# Altium footprint library RF Module.PcbLib: 28 footprints (part 2 of 2)
Each footprint in its own frame and in the unit in brackets; x right, y up, seen from the top. Pads: shape width x height; smd on the part's side, far side on the other; paste and mask are expansions set on the pad; w line width, h text height; cw(c..) or ccw(c..) is an arc to the next point about the centre after c.
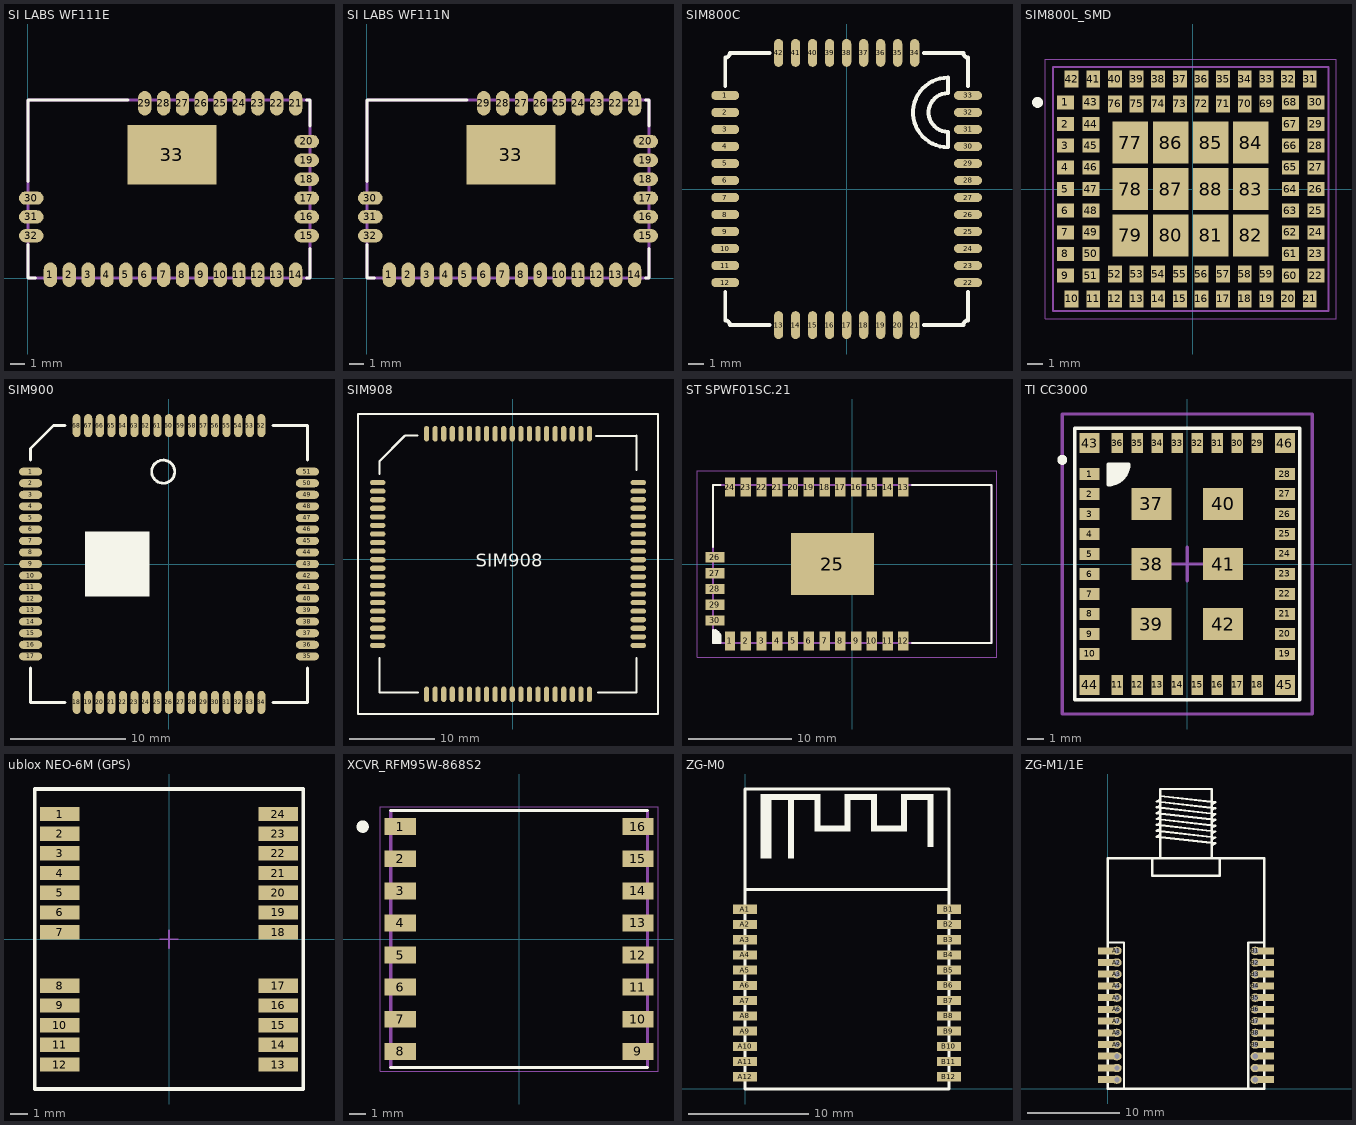
[diagram p1: the footprints below, top view; thin cyan lines are the x and y axes]

## SI LABS WF111E [mm]
height 2.1
pads (33):
  oval 0.9x1.65 smd: 1(1.515,0.225) 2(2.785,0.225) 3(4.055,0.225) 4(5.325,0.225) 5(6.595,0.225) 6(7.865,0.225) 7(9.135,0.225) 8(10.405,0.225) 9(11.675,0.225) 10(12.945,0.225) 11(14.215,0.225) 12(15.485,0.225) 13(16.755,0.225) 14(18.025,0.225) 21(18.025,11.775) 22(16.755,11.775) 23(15.485,11.775) 24(14.215,11.775) 25(12.945,11.775) 26(11.675,11.775) 27(10.405,11.775) 28(9.135,11.775) 29(7.865,11.775)
  oval 1.65x0.9 smd: 15(18.775,2.85) 16(18.775,4.12) 17(18.775,5.39) 18(18.775,6.66) 19(18.775,7.93) 20(18.775,9.2) 30(0.225,5.39) 31(0.225,4.12) 32(0.225,2.85)
  rect 6x4 smd: 33(9.7,8.3)
Top Overlay:
  lines w0.2: 0,2.25 0,0 0.5,0 ; 0,6.5 0,12 6.75,12 ; 18.75,0 19,0 19,2 ; 18.75,12 19,12 19,10.25
Mechanical 1:
  lines w0.2: 0,0 0,12 19,12 19,0 0,0
3D body "WF111E.STEP": height 2.2, standoff 0, extent 0,0 19,12

## SI LABS WF111N [mm]
height 2.1
pads (33):
  oval 0.9x1.65 smd: 1(1.515,0.225) 2(2.785,0.225) 3(4.055,0.225) 4(5.325,0.225) 5(6.595,0.225) 6(7.865,0.225) 7(9.135,0.225) 8(10.405,0.225) 9(11.675,0.225) 10(12.945,0.225) 11(14.215,0.225) 12(15.485,0.225) 13(16.755,0.225) 14(18.025,0.225) 21(18.025,11.775) 22(16.755,11.775) 23(15.485,11.775) 24(14.215,11.775) 25(12.945,11.775) 26(11.675,11.775) 27(10.405,11.775) 28(9.135,11.775) 29(7.865,11.775)
  oval 1.65x0.9 smd: 15(18.775,2.85) 16(18.775,4.12) 17(18.775,5.39) 18(18.775,6.66) 19(18.775,7.93) 20(18.775,9.2) 30(0.225,5.39) 31(0.225,4.12) 32(0.225,2.85)
  rect 6x4 smd: 33(9.7,8.3)
Top Overlay:
  lines w0.2: 0,2.25 0,0 0.5,0 ; 0,6.5 0,12 6.75,12 ; 18.75,0 19,0 19,2 ; 18.75,12 19,12 19,10.25
Mechanical 1:
  lines w0.2: 0,0 0,12 19,12 19,0 0,0
3D body "WF111N.STEP": height 2.1, standoff 0, extent 0,0 19,12

## SIM800C [mm]
pads (42):
  oval 1.8x0.6 smd: 1(-7.85,6.05) 2(-7.85,4.95) 3(-7.85,3.85) 4(-7.85,2.75) 5(-7.85,1.65) 6(-7.85,0.55) 7(-7.85,-0.55) 8(-7.85,-1.65) 9(-7.85,-2.75) 10(-7.85,-3.85) 11(-7.85,-4.95) 12(-7.85,-6.05) 22(7.85,-6.05) 23(7.85,-4.95) 24(7.85,-3.85) 25(7.85,-2.75) 26(7.85,-1.65) 27(7.85,-0.55) 28(7.85,0.55) 29(7.85,1.65) 30(7.85,2.75) 31(7.85,3.85) 32(7.85,4.95) 33(7.85,6.05)
  oval 0.6x1.8 smd: 13(-4.4,-8.8) 14(-3.3,-8.8) 15(-2.2,-8.8) 16(-1.1,-8.8) 17(0,-8.8) 18(1.1,-8.8) 19(2.2,-8.8) 20(3.3,-8.8) 21(4.4,-8.8) 34(4.4,8.8) 35(3.3,8.8) 36(2.2,8.8) 37(1.1,8.8) 38(0,8.8) 39(-1.1,8.8) 40(-2.2,8.8) 41(-3.3,8.8) 42(-4.4,8.8)
Top Overlay:
  lines w0.254: -7.85,-6.65 -7.85,-8.5 cw(c-7.85,-8.8) -7.55,-8.8 -5,-8.8 ; -7.85,6.65 -7.85,8.5 ccw(c-7.85,8.8) -7.55,8.8 -5,8.8 ; 5,-8.8 7.55,-8.8 cw(c7.85,-8.8) 7.85,-8.5 7.85,-6.65 ; 5,8.8 7.55,8.8 ccw(c7.85,8.8) 7.85,8.5 7.85,6.65 ; 6.55,2.7 cw(c6.55,4.95) 6.55,7.2 6.55,6.2 ccw(c6.55,4.95) 6.55,3.7 6.55,2.7
3D body "User Library-SIM800C-1.STEP": height 2.37, standoff 0.03, extent -7.85,-8.8 7.85,8.8

## SIM800L_SMD [mm]
pads (88):
  rect 1.1x0.9 smd: 1(-8.252,5.625) 2(-8.252,4.225) 3(-8.252,2.825) 4(-8.252,1.425) 5(-8.252,0.025) 6(-8.252,-1.375) 7(-8.252,-2.775) 8(-8.252,-4.175) 9(-8.252,-5.575) 22(7.948,-5.575) 23(7.948,-4.175) 24(7.948,-2.775) 25(7.948,-1.375) 26(7.948,0.025) 27(7.948,1.425) 28(7.948,2.825) 29(7.948,4.225) 30(7.948,5.625) 43(-6.602,5.625) 44(-6.602,4.225) 45(-6.602,2.825) 46(-6.602,1.425) 47(-6.602,0.025) 48(-6.602,-1.375) 49(-6.602,-2.775) 50(-6.602,-4.175) 51(-6.602,-5.575) 60(6.298,-5.575) 61(6.298,-4.175) 62(6.298,-2.775) 63(6.298,-1.375) 64(6.298,0.025) 65(6.298,1.425) 66(6.298,2.825) 67(6.298,4.225) 68(6.298,5.625)
  rect 0.9x1.1 smd: 10(-7.852,-7.075) 11(-6.452,-7.075) 12(-5.052,-7.075) 13(-3.652,-7.075) 14(-2.252,-7.075) 15(-0.852,-7.075) 16(0.548,-7.075) 17(1.948,-7.075) 18(3.348,-7.075) 19(4.748,-7.075) 20(6.148,-7.075) 21(7.548,-7.075) 31(7.548,7.125) 32(6.148,7.125) 33(4.748,7.125) 34(3.348,7.125) 35(1.948,7.125) 36(0.548,7.125) 37(-0.852,7.125) 38(-2.252,7.125) 39(-3.652,7.125) 40(-5.052,7.125) 41(-6.452,7.125) 42(-7.852,7.125) 52(-5.052,-5.475) 53(-3.652,-5.475) 54(-2.252,-5.475) 55(-0.852,-5.475) 56(0.548,-5.475) 57(1.948,-5.475) 58(3.348,-5.475) 59(4.748,-5.475) 69(4.748,5.525) 70(3.348,5.525) 71(1.948,5.525) 72(0.548,5.525) 73(-0.852,5.525) 74(-2.252,5.525) 75(-3.652,5.525) 76(-5.052,5.525)
  rect 2.3x2.7 smd: 77(-4.052,3.025) 78(-4.052,0.025) 79(-4.052,-2.975) 80(-1.452,-2.975) 81(1.148,-2.975) 82(3.748,-2.975) 83(3.748,0.025) 84(3.748,3.025) 85(1.148,3.025) 86(-1.452,3.025) 87(-1.452,0.025) 88(1.148,0.025)
Top Overlay:
  circle w0.5: c-10.052,5.625 r0.1
Mechanical 13:
  circle w0.2: c-10.052,5.625 r0.1
  lines w0.127: -9.052,-7.875 -9.052,7.925 8.748,7.925 8.748,-7.875 -9.052,-7.875
Mechanical 15:
  lines w0.05: -9.552,-8.375 9.248,-8.375 9.248,8.425 -9.552,8.425 -9.552,-8.375
3D body "step_temp.STEP": height 2.55, standoff 0, extent -9.052,-7.875 8.748,7.925

## SIM900 [mm]
height 10.95
pads (68):
  oval 2x0.7 smd: 1(-12,8) 2(-12,7) 3(-12,6) 4(-12,5) 5(-12,4) 6(-12,3) 7(-12,2) 8(-12,1) 9(-12,0) 10(-12,-1) 11(-12,-2) 12(-12,-3) 13(-12,-4) 14(-12,-5) 15(-12,-6) 16(-12,-7) 17(-12,-8) 35(12,-8) 36(12,-7) 37(12,-6) 38(12,-5) 39(12,-4) 40(12,-3) 41(12,-2) 42(12,-1) 43(12,0) 44(12,1) 45(12,2) 46(12,3) 47(12,4) 48(12,5) 49(12,6) 50(12,7) 51(12,8)
  oval 0.7x2 smd: 18(-8,-12) 19(-7,-12) 20(-6,-12) 21(-5,-12) 22(-4,-12) 23(-3,-12) 24(-2,-12) 25(-1,-12) 26(0,-12) 27(1,-12) 28(2,-12) 29(3,-12) 30(4,-12) 31(5,-12) 32(6,-12) 33(7,-12) 34(8,-12) 52(8,12) 53(7,12) 54(6,12) 55(5,12) 56(4,12) 57(3,12) 58(2,12) 59(1,12) 60(0,12) 61(-1,12) 62(-2,12) 63(-3,12) 64(-4,12) 65(-5,12) 66(-6,12) 67(-7,12) 68(-8,12)
Top Overlay:
  circle w0.254: c-0.5,8 r1
  rectangle: -7.3,-2.8 -1.7,2.8
  lines w0.254: -12,-9 -12,-12 -9,-12 ; -12,9 -12,10 -10,12 -9,12 ; 9,-12 12,-12 12,-9 ; 9,12 12,12 12,9
3D body "User Library-SIM900.STEP": height 3.02, standoff 0, extent -12,-12 12,12

## SIM908 [mm]
pads (80):
  oval 1.8x0.6 smd: 1(-15.731,8.952) 2(-15.731,7.952) 3(-15.731,6.952) 4(-15.731,5.952) 5(-15.731,4.952) 6(-15.731,3.952) 7(-15.731,2.952) 8(-15.731,1.952) 9(-15.731,0.952) 10(-15.731,-0.048) 11(-15.731,-1.048) 12(-15.731,-2.048) 13(-15.731,-3.048) 14(-15.731,-4.048) 15(-15.731,-5.048) 16(-15.731,-6.048) 17(-15.731,-7.048) 18(-15.731,-8.048) 19(-15.731,-9.048) 20(-15.731,-10.048) 41(14.669,-10.048) 42(14.669,-9.048) 43(14.669,-8.048) 44(14.669,-7.048) 45(14.669,-6.048) 46(14.669,-5.048) 47(14.669,-4.048) 48(14.669,-3.048) 49(14.669,-2.048) 50(14.669,-1.048) 51(14.669,-0.048) 52(14.669,0.952) 53(14.669,1.952) 54(14.669,2.952) 55(14.669,3.952) 56(14.669,4.952) 57(14.669,5.952) 58(14.669,6.952) 59(14.669,7.952) 60(14.669,8.952)
  oval 0.6x1.8 smd: 21(-10.031,-15.748) 22(-9.031,-15.748) 23(-8.031,-15.748) 24(-7.031,-15.748) 25(-6.031,-15.748) 26(-5.031,-15.748) 27(-4.031,-15.748) 28(-3.031,-15.748) 29(-2.031,-15.748) 30(-1.031,-15.748) 31(-0.031,-15.748) 32(0.969,-15.748) 33(1.969,-15.748) 34(2.969,-15.748) 35(3.969,-15.748) 36(4.969,-15.748) 37(5.969,-15.748) 38(6.969,-15.748) 39(7.969,-15.748) 40(8.969,-15.748) 61(8.969,14.652) 62(7.969,14.652) 63(6.969,14.652) 64(5.969,14.652) 65(4.969,14.652) 66(3.969,14.652) 67(2.969,14.652) 68(1.969,14.652) 69(0.969,14.652) 70(-0.031,14.652) 71(-1.031,14.652) 72(-2.031,14.652) 73(-3.031,14.652) 74(-4.031,14.652) 75(-5.031,14.652) 76(-6.031,14.652) 77(-7.031,14.652) 78(-8.031,14.652) 79(-9.031,14.652) 80(-10.031,14.652)
Top Overlay:
  lines w0.254: -15.531,-11.548 -15.531,-15.548 -11.031,-15.548 ; -15.531,9.952 -15.531,11.452 -12.607,14.376 -12.531,14.376 -12.531,14.452 -11.107,14.452 ; 9.767,14.376 14.393,14.376 ; 9.969,-15.548 14.469,-15.548 14.469,-11.548 ; 14.393,16.952 16.969,16.952 16.969,-18.048 -18.031,-18.048 -18.031,16.952 14.469,16.952 ; 14.469,10.452 14.469,14.452
  text "SIM908" at -4.318,-0.889 h1.52
3D body "User Library-SIM908.STEP": height 3.39, standoff 0.19, extent -15.552,-15.525 14.448,14.475

## ST SPWF01SC.21 [mm] "Serial to WiFi b/g/n intelligent modules"
height 2.35
pads (30):
  rect 1x1.85 smd: 1(-11.811,-7.435) 2(-10.287,-7.435) 3(-8.763,-7.435) 4(-7.239,-7.435) 5(-5.715,-7.435) 6(-4.191,-7.435) 7(-2.667,-7.435) 8(-1.143,-7.435) 9(0.381,-7.435) 10(1.905,-7.435) 11(3.429,-7.435) 12(4.953,-7.435) 13(4.953,7.435) 14(3.429,7.435) 15(1.905,7.435) 16(0.381,7.435) 17(-1.143,7.435) 18(-2.667,7.435) 19(-4.191,7.435) 20(-5.715,7.435) 21(-7.239,7.435) 22(-8.763,7.435) 23(-10.287,7.435) 24(-11.811,7.435)
  rect 8x6 smd: 25(-1.911,0)
  rect 1.85x1 smd: 26(-13.277,0.636) 27(-13.277,-0.888) 28(-13.277,-2.412) 29(-13.277,-3.936) 30(-13.277,-5.46)
Top Overlay:
  region: -13.462,-7.62 -13.462,-6.37 -13.13,-6.37 -12.712,-6.788 -12.712,-7.62
  lines w0.2: -13.462,1.63 -13.462,7.62 -12.712,7.62 ; 5.788,-7.62 13.462,-7.62 13.462,7.62 5.788,7.62 ; -13.462,-7.62 -13.462,-6.37 cw(c-13.462,-7.12) -12.712,-7.12 -12.712,-7.62 -13.462,-7.62
Mechanical 1:
  lines w0.2: -13.462,-7.62 -13.462,7.62 13.462,7.62 13.462,-7.62 -13.462,-7.62
Mechanical 15:
  lines w0.1: -1,0 1,0 ; 0,-1 0,1 ; -15,-9 14,-9 14,9 -15,9 -15,-9
3D body "SPWF01SC.21.STEP": height 2.6, standoff -0.03, extent -13.462,-7.62 13.462,7.62

## TI CC3000 [mm]
height 2.2
pads (46):
  rect 1.2x0.7 smd: 1(-5.85,5.4) 2(-5.85,4.2) 3(-5.85,3) 4(-5.85,1.8) 5(-5.85,0.6) 6(-5.85,-0.6) 7(-5.85,-1.8) 8(-5.85,-3) 9(-5.85,-4.2) 10(-5.85,-5.4) 19(5.85,-5.4) 20(5.85,-4.2) 21(5.85,-3) 22(5.85,-1.8) 23(5.85,-0.6) 24(5.85,0.6) 25(5.85,1.8) 26(5.85,3) 27(5.85,4.2) 28(5.85,5.4)
  rect 0.7x1.2 smd: 11(-4.2,-7.25) 12(-3,-7.25) 13(-1.8,-7.25) 14(-0.6,-7.25) 15(0.6,-7.25) 16(1.8,-7.25) 17(3,-7.25) 18(4.2,-7.25) 29(4.2,7.25) 30(3,7.25) 31(1.8,7.25) 32(0.6,7.25) 33(-0.6,7.25) 34(-1.8,7.25) 35(-3,7.25) 36(-4.2,7.25)
  rect 2.4x1.9 smd: 37(-2.15,3.6) 38(-2.15,0) 39(-2.15,-3.6) 40(2.15,3.6) 41(2.15,0) 42(2.15,-3.6)
  rect 1.2x1.2 smd: 43(-5.85,7.25) 44(-5.85,-7.25) 45(5.85,-7.25) 46(5.85,7.25)
Top Overlay:
  circle w0.3: c-7.5,6.25 r0.15
  region: -4.75,6 -4.75,4.75 -4.25,4.75 -3.5,5.5 -3.5,6
  lines w0.2: -6.75,-8.15 6.75,-8.15 6.75,8.15 -6.75,8.15 -6.75,-8.15 ; -4.75,4.75 ccw(c-4.75,6) -3.5,6 -4.75,6 -4.75,4.75
Mechanical 15:
  lines w0.2: -1,0 1,0 ; 0,-1 0,1 ; -7.5,-9 -7.5,9 7.5,9 7.5,-9 -7.5,-9
3D body "TI CC3000MOD.STEP": height 2.1, standoff 0, extent -6.75,-8.15 6.75,8.15

## ublox NEO-6M (GPS) [mm]
height 2
pads (24):
  rect 2.2x0.8 smd: 1(-6.1,7) 2(-6.1,5.9) 3(-6.1,4.8) 4(-6.1,3.7) 5(-6.1,2.6) 6(-6.1,1.5) 7(-6.1,0.4) 8(-6.1,-2.6) 9(-6.1,-3.7) 10(-6.1,-4.8) 11(-6.1,-5.9) 12(-6.1,-7) 13(6.1,-7) 14(6.1,-5.9) 15(6.1,-4.8) 16(6.1,-3.7) 17(6.1,-2.6) 18(6.1,0.4) 19(6.1,1.5) 20(6.1,2.6) 21(6.1,3.7) 22(6.1,4.8) 23(6.1,5.9) 24(6.1,7)
Top Overlay:
  lines w0.2: -7.497,-8.367 7.489,-8.367 7.489,8.397 -7.497,8.397 -7.497,-8.367
Mechanical 1:
  lines w0.1: -7.497,-8.367 -7.497,8.397 7.489,8.397 7.489,-8.367 -7.497,-8.367
Mechanical 15:
  lines w0.1: -0.5,0 0.5,0 ; 0,-0.5 0,0.5 ; -7.497,-8.367 7.489,-8.367 7.489,8.397 -7.497,8.397 -7.497,-8.367
3D body "UBLOX_GPS_NEO-6M.step": height 2.64, standoff 0, extent -6.184,-8.31 6.176,8.29

## XCVR_RFM95W-868S2 [mm]
pads (16):
  rect 1.95x1.05 smd: 1(-7.4,7) 2(-7.4,5) 3(-7.4,3) 4(-7.4,1) 5(-7.4,-1) 6(-7.4,-3) 7(-7.4,-5) 8(-7.4,-7) 9(7.4,-7) 10(7.4,-5) 11(7.4,-3) 12(7.4,-1) 13(7.4,1) 14(7.4,3) 15(7.4,5) 16(7.4,7)
Top Overlay:
  circle w0.2: c-9.75,7 r0.292
  region: -9.5,6.808 -10.011,6.808 -10.011,7.2 -9.5,7.2
  lines w0.2: -8,-8 8,-8 ; -8,8 8,8
Mechanical 13:
  lines w0.2: -8,-8 -8,8 ; 8,-8 8,8
Mechanical 15:
  lines w0.05: -8.65,-8.25 8.65,-8.25 8.65,8.25 -8.65,8.25 -8.65,-8.25
3D body "RFM95W-868S2--3DModel-STEP-56544.STEP": height 2.05, standoff 0.25, extent -7.976,-8.075 8.024,7.925

## ZG-M0 [mil]
pads (24):
  rect 80x30 smd: A1(0,589.52) A2(0,539.52) A3(0,489.52) A4(0,439.52) A5(0,389.52) A6(0,339.52) A7(0,289.52) A8(0,239.52) A9(0,189.52) A10(0,139.52) A11(0,89.52) A12(0,39.52) B1(669.29,589.52) B2(669.29,539.52) B3(669.29,489.52) B4(669.29,439.52) B5(669.29,389.52) B6(669.29,339.52) B7(669.29,289.52) B8(669.29,239.52) B9(669.29,189.52) B10(669.29,139.52) B11(669.29,89.52) B12(669.29,39.52)
Top Overlay:
  rectangle: 50.94,755.52 86.37,956.52
  rectangle: 51,948.5 247.85,968.19
  rectangle: 141.56,755.59 161.24,957.59
  rectangle: 228.17,844.57 247.85,955.59
  rectangle: 238,844.57 338,864.25
  rectangle: 326.59,844.57 346.28,955.59
  rectangle: 326.59,948.5 432.89,968.19
  rectangle: 424,844.57 522,864.25
  rectangle: 413.21,844.57 432.89,955.59
  rectangle: 511.63,844.57 531.32,955.59
  rectangle: 511.63,948.5 617.93,968.19
  rectangle: 598.18,793.31 617.87,955.52
  lines w10: 0,654.15 669.29,654.15 ; 669.29,0 0,0 0,984.15 669.29,984.15 669.29,0.79

## ZG-M1/1E [mil]
pads (48):
  rect 80x30 smd: A1(0,589.52) A2(0,539.52) A3(0,489.52) A4(0,439.52) A5(0,389.52) A6(0,339.52) A7(0,289.52) A8(0,239.52) A9(0,189.52) A10(0,139.52) A11(0,89.52) A12(0,39.52) B1(669.29,589.52) B2(669.29,539.52) B3(669.29,489.52) B4(669.29,439.52) B5(669.29,389.52) B6(669.29,339.52) B7(669.29,289.52) B8(669.29,239.52) B9(669.29,189.52) B10(669.29,139.52) B11(669.29,89.52) B12(669.29,39.52)
  oval 40x35 hole 22: A1(39.54,589.3) A2(39.54,539.3) A3(39.54,489.3) A4(39.54,439.3) A5(39.54,389.3) A6(39.54,339.3) A7(39.54,289.3) A8(39.54,239.3) A9(39.54,189.3) A10(39.54,139.3) A11(39.54,89.3) A12(39.54,39.3) B1(629.91,589.3) B2(629.91,539.3) B3(629.91,489.3) B4(629.91,439.3) B5(629.91,389.3) B6(629.91,339.3) B7(629.91,289.3) B8(629.91,239.3) B9(629.91,189.3) B10(629.91,139.3) B11(629.91,89.3) B12(629.91,39.3)
Top Overlay:
  lines w10: 0,625 70,625 70,0 ; 225,984.15 225,1280 445,1280 445,984.15 ; 225,1085 209.63,1076.75 460.37,1048.25 445,1040 ; 225,1110 210.19,1101.68 460.37,1073.25 445,1065 ; 225,1135 209.63,1126.75 459.81,1098.32 445,1090 ; 225,1160 209.63,1151.75 459.81,1123.32 445,1115 ; 225,1185 210.19,1176.68 459.81,1148.32 445,1140 ; 225,1210 210.19,1201.68 459.81,1173.32 445,1160 ; 225,1235 210.19,1226.68 459.81,1198.32 445,1190 ; 225,1250 459.81,1223.32 445,1215 ; 600,0 600,625 669.29,625 ; 669.29,0.79 669.29,984.15 ; 0,0 0,984.15 ; 0,0 669.29,0 669.29,984.15 ; 0,0 0,984.15 ; 0,984.15 190,984.15 ; 190,984.15 190,910 479.29,910 479.29,984.15 ; 190,984.15 479.29,984.15 ; 479.29,984.15 669.29,984.15